# Altium footprint library 2.54插件排母.PcbLib: 74 footprints (part 1 of 5)
Each footprint in its own frame and in the unit in brackets; x right, y up, seen from the top. Pads: shape width x height; smd on the part's side, far side on the other; paste and mask are expansions set on the pad; w line width, h text height; cw(c..) or ccw(c..) is an arc to the next point about the centre after c.
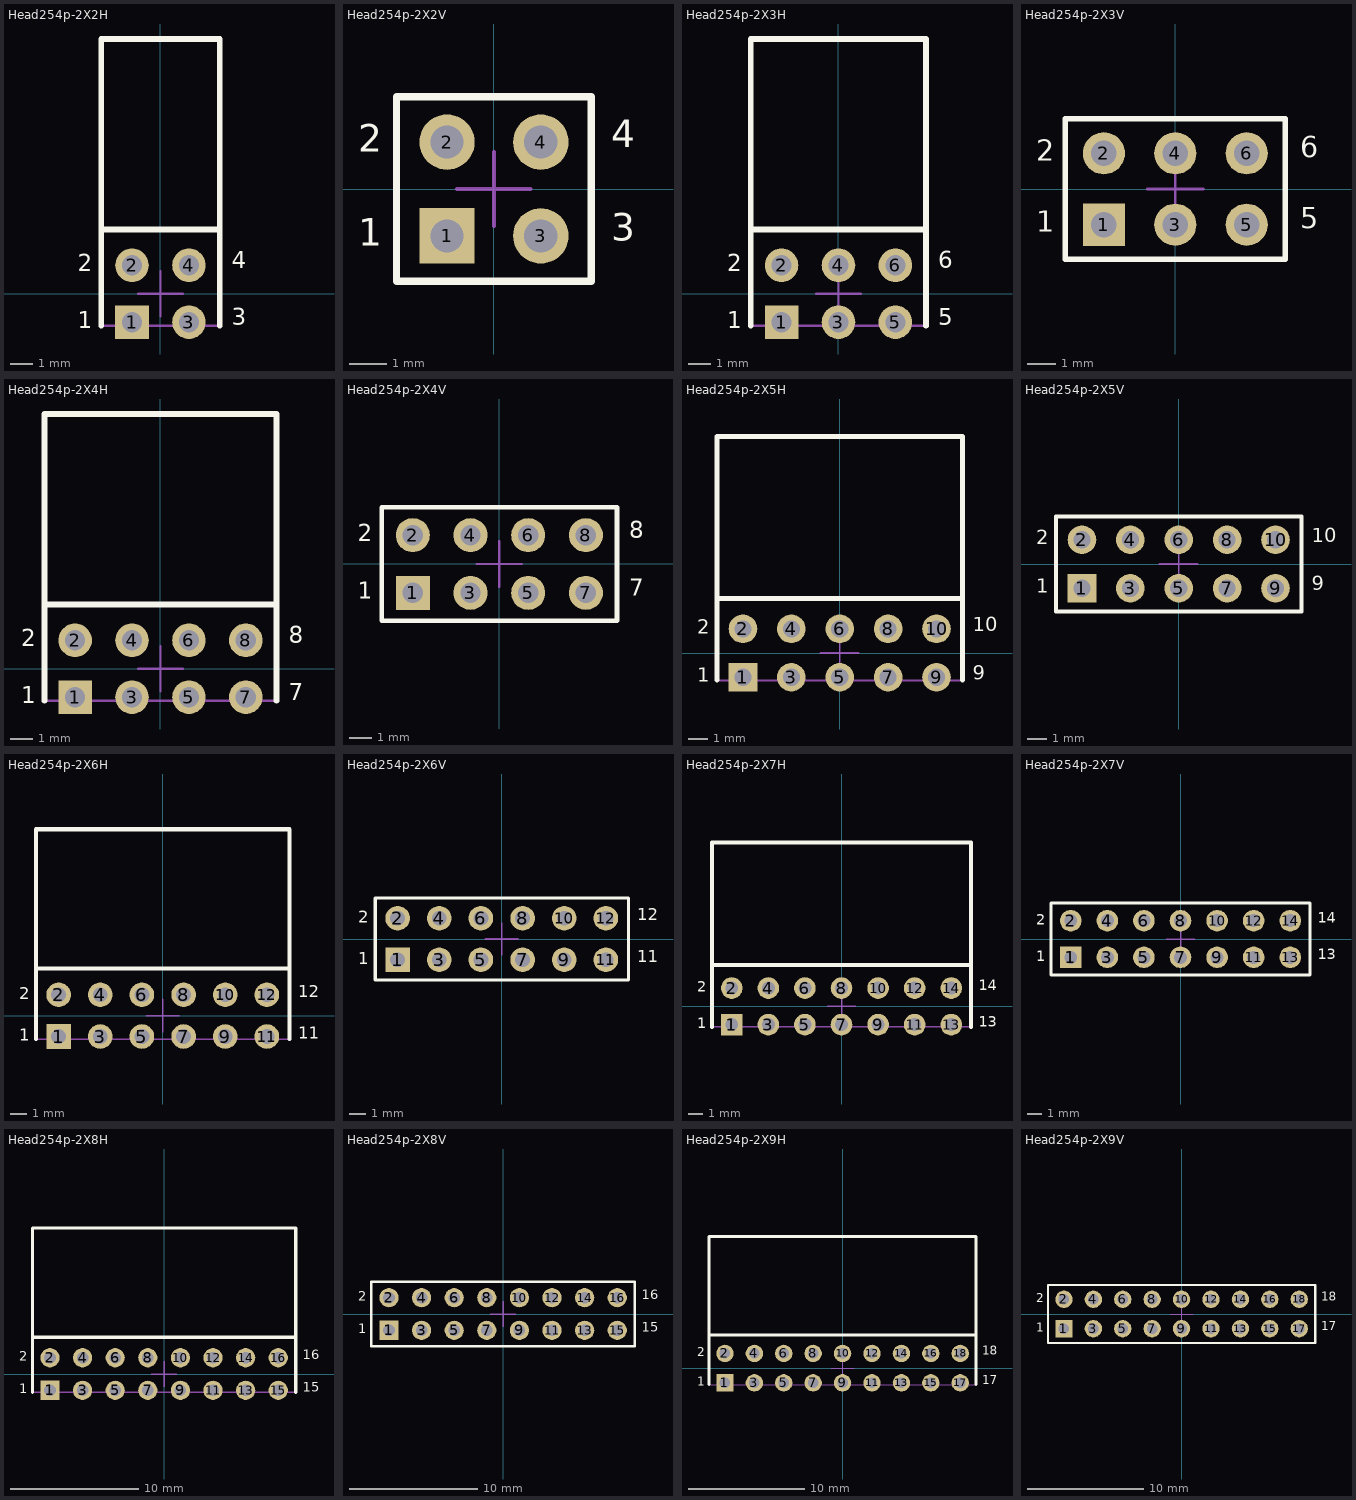
[diagram p0: the footprints below, top view; thin cyan lines are the x and y axes]

## Head254p-2X2H [mm] "2.54脚距 90度 插件 双排母"
height 5
pads (4):
  rect 1.5x1.5 hole 0.9: 1(-1.27,-1.27)
  round 1.5 hole 0.9: 2(-1.27,1.27) 3(1.27,-1.27) 4(1.27,1.27)
Top Overlay:
  lines w0.254: -2.64,-1.43 -2.64,11.37 2.64,11.37 2.64,-1.43 ; -2.64,2.87 2.64,2.87
  text "4" at 3.175,0.889 h1.27
  text "3" at 3.175,-1.651 h1.27
  text "1" at -3.683,-1.778 h1.27
  text "2" at -3.683,0.762 h1.27
Mechanical 13:
  lines w0.1: -2.64,-1.43 2.64,-1.43 2.64,11.37 -2.64,11.37 -2.64,-1.43
Mechanical 15:
  lines w0.1: -1,0 1,0 ; 0,-1 0,1
3D body: height 5.04, standoff -2.35, extent -2.64,-1.43 2.64,11.37

## Head254p-2X2V [mm] "2.54脚距 180度 插件 双排母"
height 9
pads (4):
  rect 1.5x1.5 hole 0.9: 1(-1.27,-1.27)
  round 1.5 hole 0.9: 2(-1.27,1.27) 3(1.27,-1.27) 4(1.27,1.27)
Top Overlay:
  lines w0.2: -2.64,-2.5 2.64,-2.5 2.64,2.5 -2.64,2.5 -2.64,-2.5
  text "2" at -3.683,0.762 h1.27
  text "1" at -3.683,-1.778 h1.27
  text "3" at 3.175,-1.651 h1.27
  text "4" at 3.175,0.889 h1.27
Mechanical 13:
  lines w0.1: -2.64,-2.5 -2.64,2.5 2.64,2.5 2.64,-2.5 -2.64,-2.5
Mechanical 15:
  lines w0.1: -1,0 1,0 ; 0,-1 0,1
3D body: height 8.5, standoff -3, extent -2.64,-2.5 2.64,2.5

## Head254p-2X3H [mm] "2.54脚距 90度 插件 双排母"
height 5
pads (6):
  rect 1.5x1.5 hole 0.9: 1(-2.54,-1.27)
  round 1.5 hole 0.9: 2(-2.54,1.27) 3(0,-1.27) 4(0,1.27) 5(2.54,-1.27) 6(2.54,1.27)
Top Overlay:
  lines w0.254: -3.91,-1.43 -3.91,11.37 3.91,11.37 3.91,-1.43 ; -3.91,2.87 3.91,2.87
  text "2" at -4.953,0.762 h1.27
  text "1" at -4.953,-1.778 h1.27
  text "5" at 4.445,-1.651 h1.27
  text "6" at 4.445,0.889 h1.27
Mechanical 13:
  lines w0.1: -3.91,-1.43 -3.91,11.37 3.91,11.37 3.91,-1.43 -3.91,-1.43
Mechanical 15:
  lines w0.1: -1,0 1,0 ; 0,-1 0,1
3D body: height 5.04, standoff -2.35, extent -3.91,-1.43 3.91,11.37

## Head254p-2X3V [mm] "2.54脚距 180度 插件 双排母"
height 9
pads (6):
  rect 1.5x1.5 hole 0.9: 1(-2.54,-1.27)
  round 1.5 hole 0.9: 2(-2.54,1.27) 3(0,-1.27) 4(0,1.27) 5(2.54,-1.27) 6(2.54,1.27)
Top Overlay:
  lines w0.2: -3.91,-2.5 -3.91,2.5 3.91,2.5 3.91,-2.5 -3.91,-2.5
  text "6" at 4.445,0.889 h1.27
  text "5" at 4.445,-1.651 h1.27
  text "1" at -4.953,-1.778 h1.27
  text "2" at -4.953,0.762 h1.27
Mechanical 13:
  lines w0.1: -3.91,-2.5 3.91,-2.5 3.91,2.5 -3.91,2.5 -3.91,-2.5
Mechanical 15:
  lines w0.1: -1,0 1,0 ; 0,-1 0,1
3D body: height 8.5, standoff -3, extent -3.91,-2.5 3.91,2.5

## Head254p-2X4H [mm] "2.54脚距 90度 插件 双排母"
height 5
pads (8):
  rect 1.5x1.5 hole 0.9: 1(-3.81,-1.27)
  round 1.5 hole 0.9: 2(-3.81,1.27) 3(-1.27,-1.27) 4(-1.27,1.27) 5(1.27,-1.27) 6(1.27,1.27) 7(3.81,-1.27) 8(3.81,1.27)
Top Overlay:
  lines w0.254: -5.18,-1.43 -5.18,11.37 5.18,11.37 5.18,-1.43 ; -5.18,2.87 5.18,2.87
  text "2" at -6.223,0.762 h1.27
  text "1" at -6.223,-1.778 h1.27
  text "7" at 5.715,-1.651 h1.27
  text "8" at 5.715,0.889 h1.27
Mechanical 13:
  lines w0.1: -5.18,-1.43 -5.18,11.37 5.18,11.37 5.18,-1.43 -5.18,-1.43
Mechanical 15:
  lines w0.1: -1,0 1,0 ; 0,-1 0,1
3D body: height 5.04, standoff -2.35, extent -5.18,-1.43 5.18,11.37

## Head254p-2X4V [mm] "2.54脚距 180度 插件 双排母"
height 9
pads (8):
  rect 1.5x1.5 hole 0.9: 1(-3.81,-1.27)
  round 1.5 hole 0.9: 2(-3.81,1.27) 3(-1.27,-1.27) 4(-1.27,1.27) 5(1.27,-1.27) 6(1.27,1.27) 7(3.81,-1.27) 8(3.81,1.27)
Top Overlay:
  lines w0.2: -5.18,-2.5 -5.18,2.5 5.18,2.5 5.18,-2.5 -5.18,-2.5
  text "8" at 5.715,0.889 h1.27
  text "7" at 5.715,-1.651 h1.27
  text "1" at -6.223,-1.778 h1.27
  text "2" at -6.223,0.762 h1.27
Mechanical 13:
  lines w0.1: -5.18,-2.5 5.18,-2.5 5.18,2.5 -5.18,2.5 -5.18,-2.5
Mechanical 15:
  lines w0.1: -1,0 1,0 ; 0,-1 0,1
3D body: height 8.5, standoff -3, extent -5.18,-2.5 5.18,2.5

## Head254p-2X5H [mm] "2.54脚距 90度 插件 双排母"
height 5
pads (10):
  rect 1.5x1.5 hole 0.9: 1(-5.08,-1.27)
  round 1.5 hole 0.9: 2(-5.08,1.27) 3(-2.54,-1.27) 4(-2.54,1.27) 5(0,-1.27) 6(0,1.27) 7(2.54,-1.27) 8(2.54,1.27) 9(5.08,-1.27) 10(5.08,1.27)
Top Overlay:
  lines w0.254: -6.45,-1.43 -6.45,11.37 6.45,11.37 6.45,-1.43 ; -6.45,2.87 6.45,2.87
  text "10" at 6.985,0.889 h1.27
  text "9" at 6.985,-1.651 h1.27
  text "1" at -7.493,-1.778 h1.27
  text "2" at -7.493,0.762 h1.27
Mechanical 13:
  lines w0.1: -6.45,-1.43 6.45,-1.43 6.45,11.37 -6.45,11.37 -6.45,-1.43
Mechanical 15:
  lines w0.1: -1,0 1,0 ; 0,-1 0,1
3D body: height 5.04, standoff -2.35, extent -6.45,-1.43 6.45,11.37

## Head254p-2X5V [mm] "2.54脚距 180度 插件 双排母"
height 9
pads (10):
  rect 1.5x1.5 hole 0.9: 1(-5.08,-1.27)
  round 1.5 hole 0.9: 2(-5.08,1.27) 3(-2.54,-1.27) 4(-2.54,1.27) 5(0,-1.27) 6(0,1.27) 7(2.54,-1.27) 8(2.54,1.27) 9(5.08,-1.27) 10(5.08,1.27)
Top Overlay:
  lines w0.2: -6.45,-2.5 6.45,-2.5 6.45,2.5 -6.45,2.5 -6.45,-2.5
  text "2" at -7.493,0.762 h1.27
  text "1" at -7.493,-1.778 h1.27
  text "9" at 6.985,-1.651 h1.27
  text "10" at 6.985,0.889 h1.27
Mechanical 13:
  lines w0.1: -6.45,-2.5 -6.45,2.5 6.45,2.5 6.45,-2.5 -6.45,-2.5
Mechanical 15:
  lines w0.1: -1,0 1,0 ; 0,-1 0,1
3D body: height 8.5, standoff -3, extent -6.45,-2.5 6.45,2.5

## Head254p-2X6H [mm] "2.54脚距 90度 插件 双排母"
height 5
pads (12):
  rect 1.5x1.5 hole 0.9: 1(-6.35,-1.27)
  round 1.5 hole 0.9: 2(-6.35,1.27) 3(-3.81,-1.27) 4(-3.81,1.27) 5(-1.27,-1.27) 6(-1.27,1.27) 7(1.27,-1.27) 8(1.27,1.27) 9(3.81,-1.27) 10(3.81,1.27) 11(6.35,-1.27) 12(6.35,1.27)
Top Overlay:
  lines w0.254: -7.72,-1.43 -7.72,11.37 7.72,11.37 7.72,-1.43 ; -7.72,2.87 7.72,2.87
  text "12" at 8.255,0.889 h1.27
  text "11" at 8.255,-1.651 h1.27
  text "1" at -8.763,-1.778 h1.27
  text "2" at -8.763,0.762 h1.27
Mechanical 13:
  lines w0.1: -7.72,-1.43 7.72,-1.43 7.72,11.37 -7.72,11.37 -7.72,-1.43
Mechanical 15:
  lines w0.1: -1,0 1,0 ; 0,-1 0,1
3D body: height 5.04, standoff -2.35, extent -7.72,-1.43 7.72,11.37

## Head254p-2X6V [mm] "2.54脚距 180度 插件 双排母"
height 9
pads (12):
  rect 1.5x1.5 hole 0.9: 1(-6.35,-1.27)
  round 1.5 hole 0.9: 2(-6.35,1.27) 3(-3.81,-1.27) 4(-3.81,1.27) 5(-1.27,-1.27) 6(-1.27,1.27) 7(1.27,-1.27) 8(1.27,1.27) 9(3.81,-1.27) 10(3.81,1.27) 11(6.35,-1.27) 12(6.35,1.27)
Top Overlay:
  lines w0.2: -7.72,-2.5 7.72,-2.5 7.72,2.5 -7.72,2.5 -7.72,-2.5
  text "2" at -8.763,0.762 h1.27
  text "1" at -8.763,-1.778 h1.27
  text "11" at 8.255,-1.651 h1.27
  text "12" at 8.255,0.889 h1.27
Mechanical 13:
  lines w0.1: -7.72,-2.5 -7.72,2.5 7.72,2.5 7.72,-2.5 -7.72,-2.5
Mechanical 15:
  lines w0.1: -1,0 1,0 ; 0,-1 0,1
3D body: height 8.5, standoff -3, extent -7.72,-2.5 7.72,2.5

## Head254p-2X7H [mm] "2.54脚距 90度 插件 双排母"
height 5
pads (14):
  rect 1.5x1.5 hole 0.9: 1(-7.62,-1.27)
  round 1.5 hole 0.9: 2(-7.62,1.27) 3(-5.08,-1.27) 4(-5.08,1.27) 5(-2.54,-1.27) 6(-2.54,1.27) 7(0,-1.27) 8(0,1.27) 9(2.54,-1.27) 10(2.54,1.27) 11(5.08,-1.27) 12(5.08,1.27) 13(7.62,-1.27) 14(7.62,1.27)
Top Overlay:
  lines w0.254: -8.99,-1.43 -8.99,11.37 8.99,11.37 8.99,-1.43 ; -8.99,2.87 8.99,2.87
  text "14" at 9.525,0.889 h1.27
  text "13" at 9.525,-1.651 h1.27
  text "1" at -10.033,-1.778 h1.27
  text "2" at -10.033,0.762 h1.27
Mechanical 13:
  lines w0.1: -8.99,-1.43 8.99,-1.43 8.99,11.37 -8.99,11.37 -8.99,-1.43
Mechanical 15:
  lines w0.1: -1,0 1,0 ; 0,-1 0,1
3D body: height 5.04, standoff -2.35, extent -8.99,-1.43 8.99,11.37

## Head254p-2X7V [mm] "2.54脚距 180度 插件 双排母"
height 9
pads (14):
  rect 1.5x1.5 hole 0.9: 1(-7.62,-1.27)
  round 1.5 hole 0.9: 2(-7.62,1.27) 3(-5.08,-1.27) 4(-5.08,1.27) 5(-2.54,-1.27) 6(-2.54,1.27) 7(0,-1.27) 8(0,1.27) 9(2.54,-1.27) 10(2.54,1.27) 11(5.08,-1.27) 12(5.08,1.27) 13(7.62,-1.27) 14(7.62,1.27)
Top Overlay:
  lines w0.2: -8.99,-2.5 -8.99,2.5 8.99,2.5 8.99,-2.5 -8.99,-2.5
  text "14" at 9.525,0.889 h1.27
  text "13" at 9.525,-1.651 h1.27
  text "1" at -10.033,-1.778 h1.27
  text "2" at -10.033,0.762 h1.27
Mechanical 13:
  lines w0.1: -8.99,-2.5 8.99,-2.5 8.99,2.5 -8.99,2.5 -8.99,-2.5
Mechanical 15:
  lines w0.1: -1,0 1,0 ; 0,-1 0,1
3D body: height 8.5, standoff -3, extent -8.99,-2.5 8.99,2.5

## Head254p-2X8H [mm] "2.54脚距 90度 插件 双排母"
height 5
pads (16):
  rect 1.5x1.5 hole 0.9: 1(-8.89,-1.27)
  round 1.5 hole 0.9: 2(-8.89,1.27) 3(-6.35,-1.27) 4(-6.35,1.27) 5(-3.81,-1.27) 6(-3.81,1.27) 7(-1.27,-1.27) 8(-1.27,1.27) 9(1.27,-1.27) 10(1.27,1.27) 11(3.81,-1.27) 12(3.81,1.27) 13(6.35,-1.27) 14(6.35,1.27) 15(8.89,-1.27) 16(8.89,1.27)
Top Overlay:
  lines w0.254: -10.26,-1.43 -10.26,11.37 10.26,11.37 10.26,-1.43 ; -10.26,2.87 10.26,2.87
  text "16" at 10.795,0.889 h1.27
  text "15" at 10.795,-1.651 h1.27
  text "1" at -11.303,-1.778 h1.27
  text "2" at -11.303,0.762 h1.27
Mechanical 13:
  lines w0.1: -10.26,-1.43 10.26,-1.43 10.26,11.37 -10.26,11.37 -10.26,-1.43
Mechanical 15:
  lines w0.1: -1,0 1,0 ; 0,-1 0,1
3D body: height 5.04, standoff -2.35, extent -10.26,-1.43 10.26,11.37

## Head254p-2X8V [mm] "2.54脚距 180度 插件 双排母"
height 9
pads (16):
  rect 1.5x1.5 hole 0.9: 1(-8.89,-1.27)
  round 1.5 hole 0.9: 2(-8.89,1.27) 3(-6.35,-1.27) 4(-6.35,1.27) 5(-3.81,-1.27) 6(-3.81,1.27) 7(-1.27,-1.27) 8(-1.27,1.27) 9(1.27,-1.27) 10(1.27,1.27) 11(3.81,-1.27) 12(3.81,1.27) 13(6.35,-1.27) 14(6.35,1.27) 15(8.89,-1.27) 16(8.89,1.27)
Top Overlay:
  lines w0.2: -10.26,-2.5 10.26,-2.5 10.26,2.5 -10.26,2.5 -10.26,-2.5
  text "2" at -11.303,0.762 h1.27
  text "1" at -11.303,-1.778 h1.27
  text "15" at 10.795,-1.651 h1.27
  text "16" at 10.795,0.889 h1.27
Mechanical 13:
  lines w0.1: -10.26,-2.5 -10.26,2.5 10.26,2.5 10.26,-2.5 -10.26,-2.5
Mechanical 15:
  lines w0.1: -1,0 1,0 ; 0,-1 0,1
3D body: height 8.5, standoff -3, extent -10.26,-2.5 10.26,2.5

## Head254p-2X9H [mm] "2.54脚距 90度 插件 双排母"
height 5
pads (18):
  rect 1.5x1.5 hole 0.9: 1(-10.16,-1.27)
  round 1.5 hole 0.9: 2(-10.16,1.27) 3(-7.62,-1.27) 4(-7.62,1.27) 5(-5.08,-1.27) 6(-5.08,1.27) 7(-2.54,-1.27) 8(-2.54,1.27) 9(0,-1.27) 10(0,1.27) 11(2.54,-1.27) 12(2.54,1.27) 13(5.08,-1.27) 14(5.08,1.27) 15(7.62,-1.27) 16(7.62,1.27) 17(10.16,-1.27) 18(10.16,1.27)
Top Overlay:
  lines w0.254: -11.53,-1.43 -11.53,11.37 11.53,11.37 11.53,-1.43 ; -11.53,2.87 11.53,2.87
  text "18" at 12.065,0.889 h1.27
  text "17" at 12.065,-1.651 h1.27
  text "1" at -12.573,-1.778 h1.27
  text "2" at -12.573,0.762 h1.27
Mechanical 13:
  lines w0.1: -11.53,-1.43 11.53,-1.43 11.53,11.37 -11.53,11.37 -11.53,-1.43
Mechanical 15:
  lines w0.1: -1,0 1,0 ; 0,-1 0,1
3D body: height 5.04, standoff -2.35, extent -11.53,-1.43 11.53,11.37

## Head254p-2X9V [mm] "2.54脚距 180度 插件 双排母"
height 9
pads (18):
  rect 1.5x1.5 hole 0.9: 1(-10.16,-1.27)
  round 1.5 hole 0.9: 2(-10.16,1.27) 3(-7.62,-1.27) 4(-7.62,1.27) 5(-5.08,-1.27) 6(-5.08,1.27) 7(-2.54,-1.27) 8(-2.54,1.27) 9(0,-1.27) 10(0,1.27) 11(2.54,-1.27) 12(2.54,1.27) 13(5.08,-1.27) 14(5.08,1.27) 15(7.62,-1.27) 16(7.62,1.27) 17(10.16,-1.27) 18(10.16,1.27)
Top Overlay:
  lines w0.2: -11.53,-2.5 11.53,-2.5 11.53,2.5 -11.53,2.5 -11.53,-2.5
  text "2" at -12.573,0.762 h1.27
  text "1" at -12.573,-1.778 h1.27
  text "17" at 12.065,-1.651 h1.27
  text "18" at 12.065,0.889 h1.27
Mechanical 13:
  lines w0.1: -11.53,-2.5 -11.53,2.5 11.53,2.5 11.53,-2.5 -11.53,-2.5
Mechanical 15:
  lines w0.1: -1,0 1,0 ; 0,-1 0,1
3D body: height 8.5, standoff -3, extent -11.53,-2.5 11.53,2.5